# Altium footprint library 布洛电子PCB封装库-电阻电容电感.PcbLib: 59 footprints (part 1 of 4)
Each footprint in its own frame and in the unit in brackets; x right, y up, seen from the top. Pads: shape width x height; smd on the part's side, far side on the other; paste and mask are expansions set on the pad; w line width, h text height; cw(c..) or ccw(c..) is an arc to the next point about the centre after c.
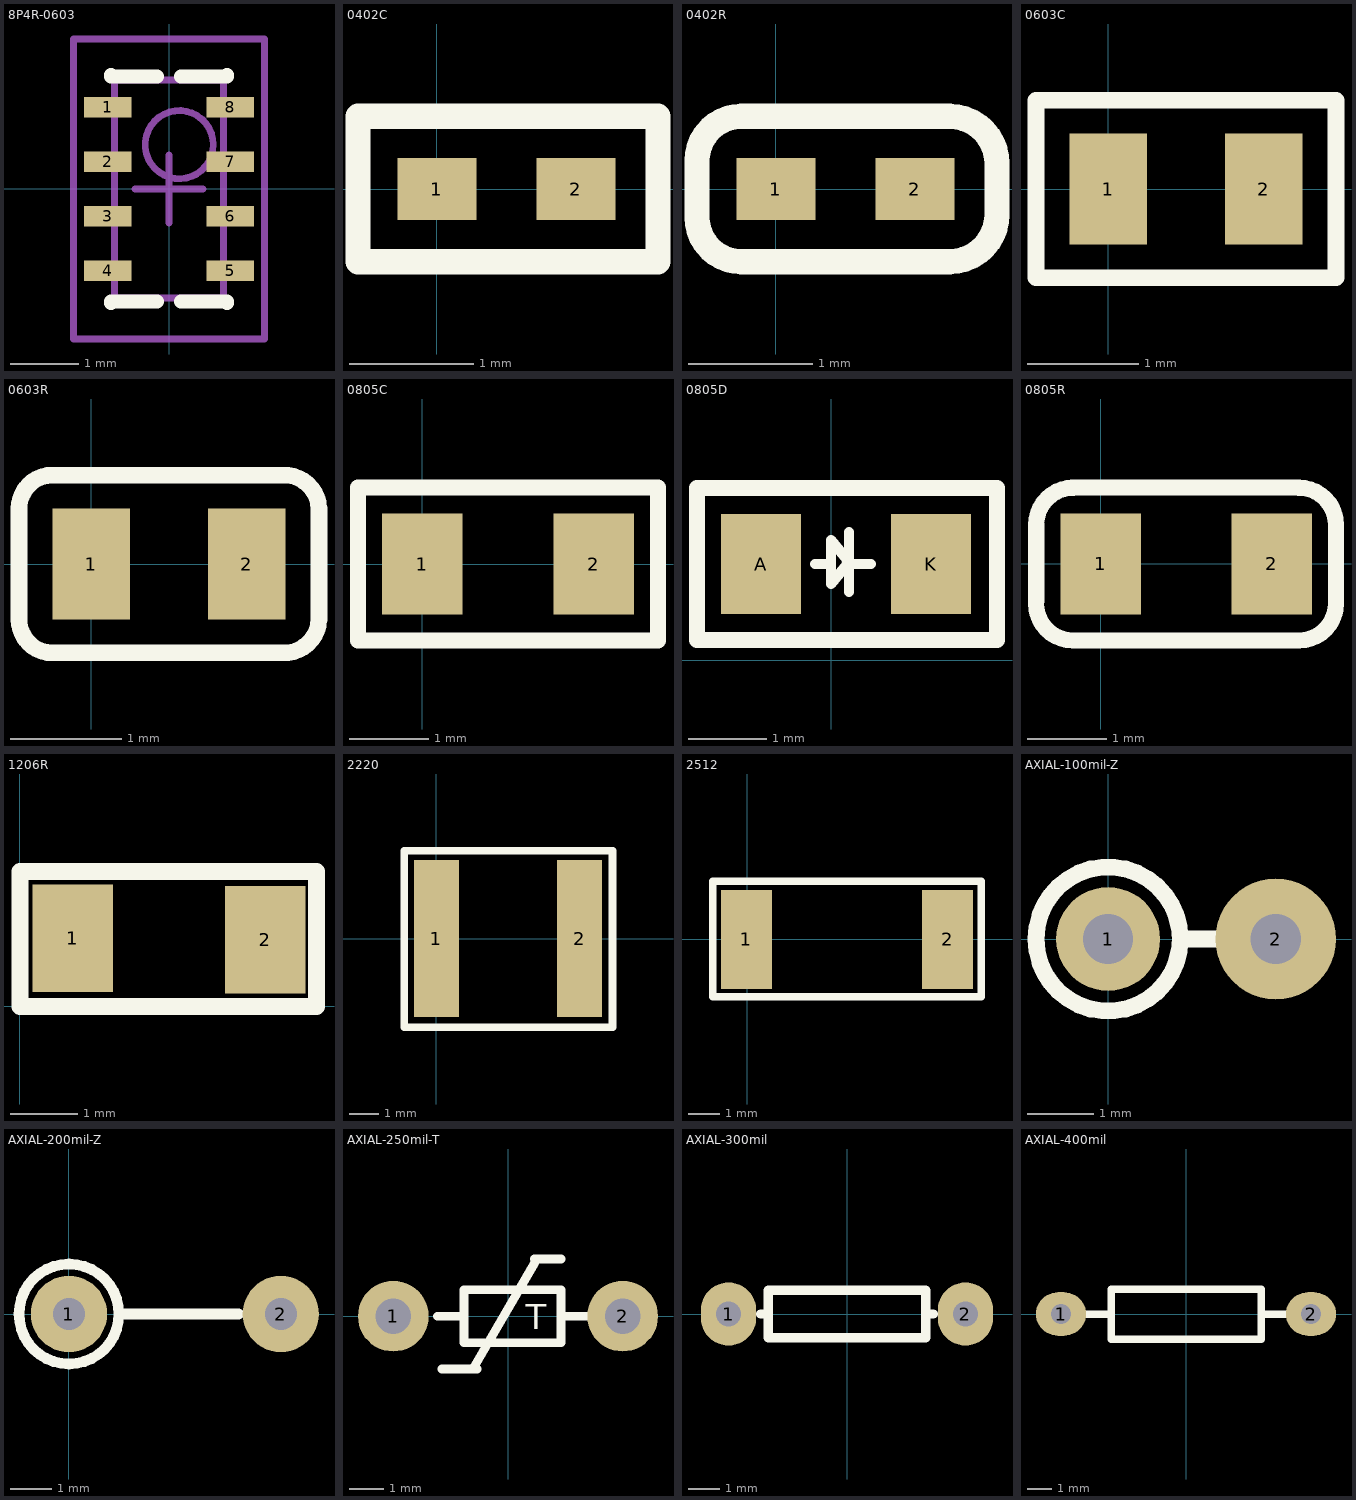
[diagram p0: the footprints below, top view; thin cyan lines are the x and y axes]

## 8P4R-0603 [mm]
pads (8):
  rect 0.7x0.3 smd: 1(-0.9,1.2) 2(-0.9,0.4) 3(-0.9,-0.4) 4(-0.9,-1.2) 5(0.9,-1.2) 6(0.9,-0.4) 7(0.9,0.4) 8(0.9,1.2)
Top Overlay:
  lines w0.2: -0.85,-1.675 -0.85,-1.65 -0.175,-1.65 ; -0.85,1.675 -0.85,1.65 -0.175,1.65 ; 0.175,-1.65 0.85,-1.65 0.85,-1.675 ; 0.175,1.65 0.85,1.65 0.85,1.675
Mechanical 13:
  circle w0.1: c0.15,0.65 r0.5
  lines w0.1: -0.8,-1.6 0.8,-1.6 0.8,1.6 -0.8,1.6 -0.8,-1.6
Mechanical 15:
  lines w0.1: -0.5,0 0.5,0 ; 0,-0.5 0,0.5 ; -1.4,-2.2 1.4,-2.2 1.4,2.2 -1.4,2.2 -1.4,-2.2
3D body: height 0.55, standoff 0, extent -0.838,-1.6 0.762,1.6

## 0402C [mm]
pads (2):
  rect 0.635x0.5 smd: 1(0,0) 2(1.118,0)
Top Overlay:
  lines w0.203: -0.635,-0.584 -0.635,0.584 1.778,0.584 1.778,-0.584 -0.635,-0.584

## 0402R [mm]
pads (2):
  rect 0.635x0.5 smd: 1(0,0) 2(1.118,0)
Top Overlay:
  lines w0.203: -0.635,-0.229 ccw(c-0.279,-0.229) -0.279,-0.584 1.397,-0.584 ccw(c1.397,-0.203) 1.778,-0.203 1.778,0.203 ccw(c1.397,0.203) 1.397,0.584 -0.279,0.584 ccw(c-0.279,0.229) -0.635,0.229 -0.635,-0.229

## 0603C [mm]
pads (2):
  rect 0.7x1 smd: 1(0,0) 2(1.4,0)
Top Overlay:
  lines w0.15: -0.65,-0.8 2.05,-0.8 2.05,0.8 -0.65,0.8 -0.65,-0.8
3D body: height 0.3, standoff 0, extent -0.089,-0.381 1.511,0.419

## 0603R [mm]
pads (2):
  rect 0.7x1 smd: 1(0,0) 2(1.4,0)
Top Overlay:
  lines w0.15: 2.05,0.475 2.05,-0.5 cw(c1.737,-0.487) 1.725,-0.8 -0.35,-0.8 cw(c-0.35,-0.5) -0.65,-0.5 -0.65,0.5 cw(c-0.35,0.5) -0.35,0.8 1.725,0.8 cw(c1.737,0.487) 2.05,0.5
3D body: height 0.3, standoff 0, extent -0.1,-0.4 1.5,0.4

## 0805C [mil]
height 39.37
pads (2):
  rect 40x50 smd: 1(0,0) 2(85,0)
Top Overlay:
  lines w8: -32,-38 -32,18.5 -32,38 -14.12,38 117,38 117,18.5 117,-38 98.11,-38 -12.7,-38 -32,-38
3D body: height 30.39, standoff -0.39, extent 3.15,-24.61 81.89,24.61

## 0805D [mil]
pads (2):
  rect 40x50 smd: A(-35,48) K(50,48)
Top Overlay:
  lines w5: -8,48 0,48 ; 9,34 9,64 9,49 ; 9,48 20,48 ; 0,48 0,60 9,49 ; 0,48 0,38 9,49
  lines w8: -47.7,10 63.11,10 ; -67,10 -67,86 -49.12,86 63.09,86 83,86 83,10 -67,10
3D body: height 43.81, standoff -15.9, extent -51,20 75,83

## 0805R [mil]
height 39.37
pads (2):
  rect 40x50 smd: 1(0,0) 2(85,0)
Top Overlay:
  lines w8: -32.11,-19.59 ccw(c-13.7,-19.59) -13.7,-38 ; -32,-18.5 -32,18.5 ; -32,19.5 cw(c-13.59,19.5) -13.59,37.91 ; -14.12,38 98.09,38 ; -12.7,-38 98.11,-38 ; 98.59,-38 ccw(c98.59,-19.59) 117,-19.59 ; 98.59,37.91 cw(c98.59,19.5) 117,19.5 ; 117,-18.59 117,18.5
3D body: height 30.39, standoff -0.39, extent 3.26,-24.61 82,24.61

## 1206R [mm]
pads (2):
  rect 1.2x1.6 smd: 1(0.787,1.016) 2(3.658,0.991)
Top Overlay:
  lines w0.254: 0,0 0,2.007 4.42,2.007 4.42,0 0,0

## 2220 [mm]
pads (2):
  rect 1.52x5.3 smd: 1(0,0) 2(4.83,0)
Top Overlay:
  lines w0.254: -1.092,-2.997 -1.092,2.972 5.944,2.972 5.944,-2.997 -1.092,-2.997
3D body: height 2.3, standoff 0, extent -0.437,-2.511 5.263,2.489

## 2512 [mm]
pads (2):
  rect 1.65x3.2 smd: 1(-0.025,0) 2(6.48,0)
Top Overlay:
  lines w0.254: -1.118,-1.854 7.569,-1.854 7.569,1.88 -1.118,1.88 -1.118,-1.854

## AXIAL-100mil-Z [mil]
pads (2):
  round 62 hole 30: 1(0,0)
  round 72 hole 30: 2(100,0)
Top Overlay:
  circle w10: c0,0 r43.01
  lines w10: 45,0 70,0

## AXIAL-200mil-Z [mil]
pads (2):
  round 72 hole 30: 1(0,0) 2(200,0)
Top Overlay:
  circle w10: c0,0 r47.17
  lines w10: 50,0 160,0

## AXIAL-250mil-T [mil]
pads (2):
  round 80 hole 40: 1(-130,0) 2(130,0)
Top Overlay:
  lines w10: -80,0 -50,0 ; -75,-60 -35,-60 ; -40,-60 30,60 ; 30,65 60,65 ; 60,0 90,0 ; -50,-30 60,-30 60,30 -50,30 -50,-30
  text "T" at 20,-15 h28

## AXIAL-300mil [mil]
pads (2):
  oval 70x80 hole 32: 1(-150,0) 2(150,0)
Top Overlay:
  lines w12: -109,0 -100,0 ; 109,0 100,0 ; 100,0 100,-30 -100,-30 -100,30 100,30 100,0

## AXIAL-400mil [mil]
pads (2):
  oval 80x70 hole 32: 1(-200,0) 2(200,0)
Top Overlay:
  lines w12: -160,0 -120,0 ; 120,0 160,0 ; -120,-40 -120,40 120,40 120,-40 -120,-40